# Altium footprint library MCx.PcbLib: 53 footprints (part 1 of 4)
Each footprint in its own frame and in the unit in brackets; x right, y up, seen from the top. Pads: shape width x height; smd on the part's side, far side on the other; paste and mask are expansions set on the pad; w line width, h text height; cw(c..) or ccw(c..) is an arc to the next point about the centre after c.
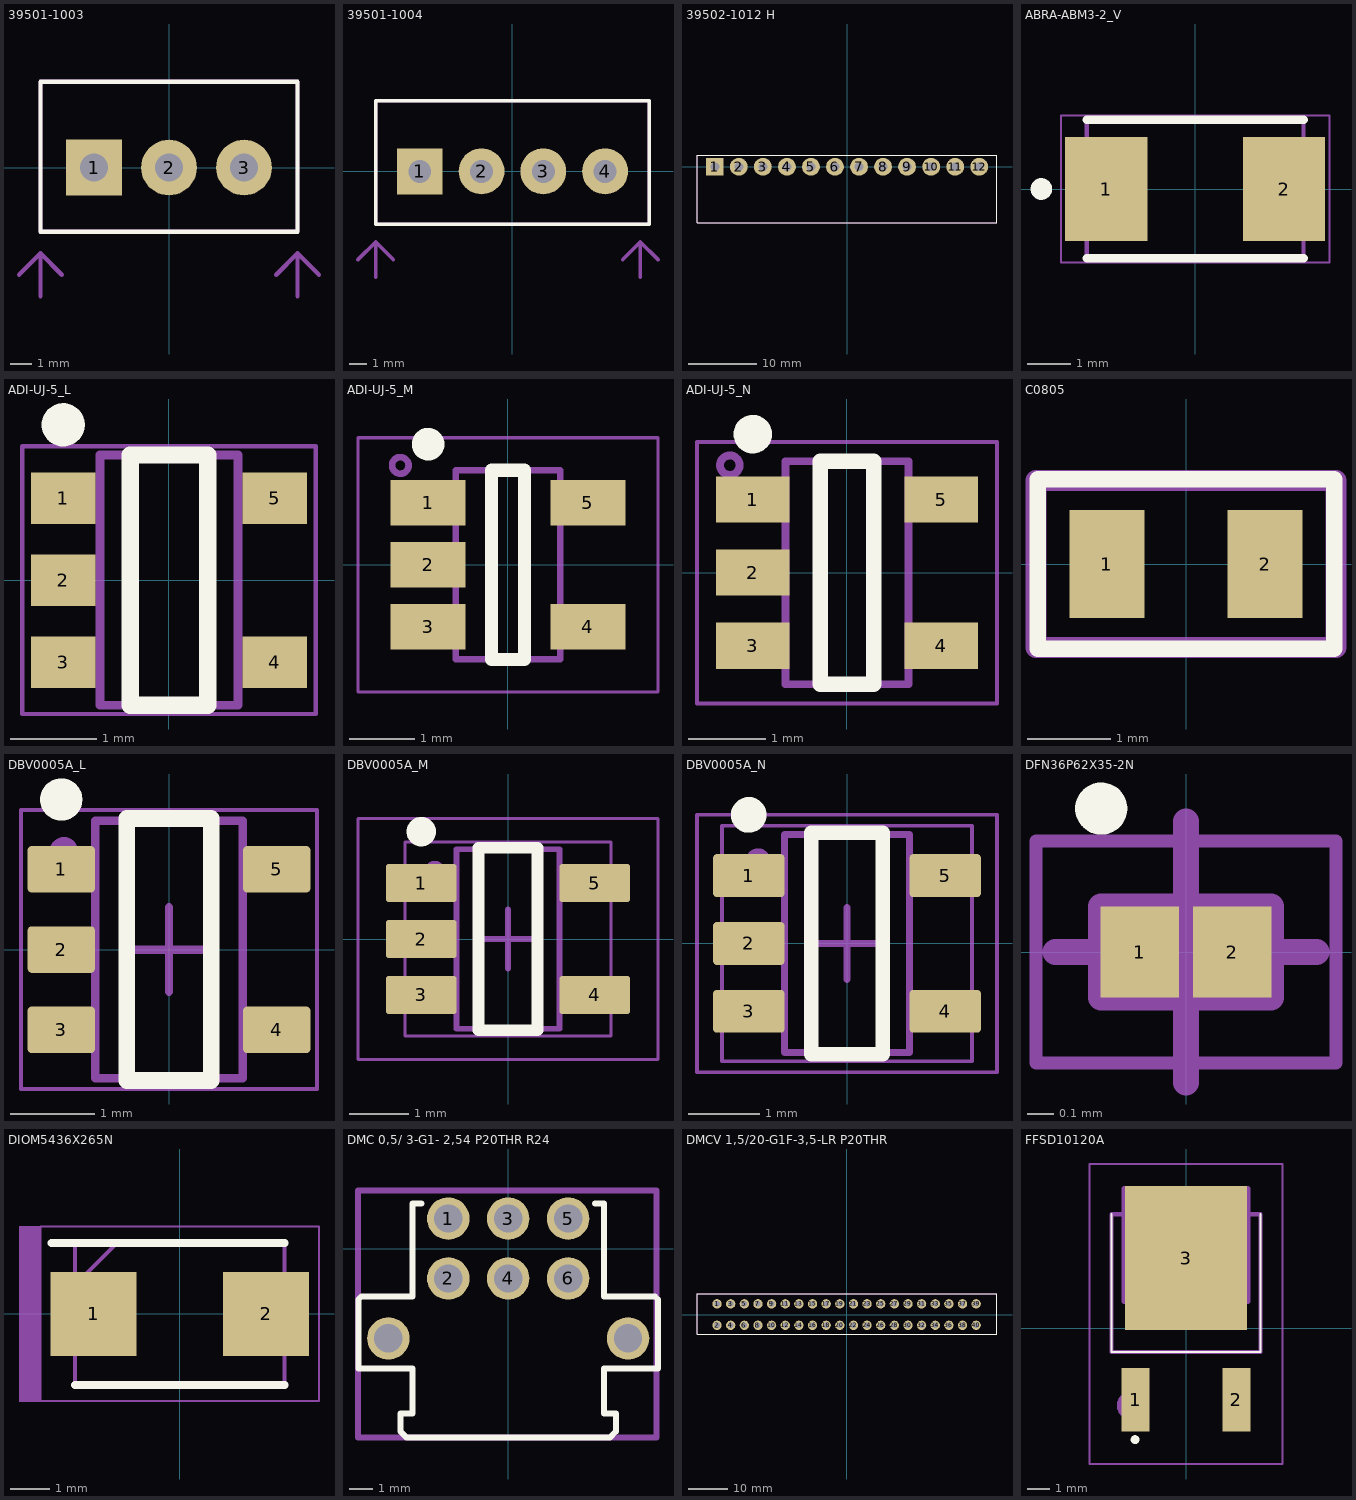
[diagram p0: the footprints below, top view; thin cyan lines are the x and y axes]

## 39501-1003 [mm] "Header 3x3.5mm Molex"
pads (3):
  rect 2.6x2.6 hole 1.3: 1(-3.5,0)
  round 2.6 hole 1.3: 2(0,0) 3(3.5,0)
Top Overlay:
  lines w0.203: -6,-3 -6,4 6,4 6,-3 -6,-3
Top Courtyard:
  lines w0.203: -6,-3 -6,4 6,4 6,-3 -6,-3
Mechanical 15:
  lines w0.203: -6,-6 -6,-5 -6,-4 ; -5,-5 -6,-4 ; 6,-6 6,-5 6,-4 ; 7,-5 6,-4 ; -6,-4 -7,-5 -6,-4 ; 6,-4 5,-5 6,-4
  text "39503-2003  / Wire Entry" at -3,-7 h1.52
Top Assembly (Mech29):
  lines w0.203: -6,-3 -6,4 6,4 6,-3 -6,-3
  text "'.Designator'" at -6.348,-0.423 h1.02
3D body "395011003.stp": height 9.16, standoff -3.54, extent -5.956,-2.794 5.956,4.064

## 39501-1004 [mm] "Header 3x3.5mm Molex"
pads (4):
  rect 2.6x2.6 hole 1.3: 1(-5.25,0)
  round 2.6 hole 1.3: 2(-1.75,0) 3(1.75,0) 4(5.25,0)
Top Overlay:
  lines w0.203: -7.75,-3 7.75,-3 7.75,4 -7.75,4 -7.75,-3
Top Courtyard:
  lines w0.203: -7.75,-3 7.75,-3 7.75,4 -7.75,4 -7.75,-3
Mechanical 15:
  lines w0.203: -7.75,-6 -7.75,-5 -7.75,-4 ; -6.75,-5 -7.75,-4 ; 7.25,-6 7.25,-5 7.25,-4 ; 8.25,-5 7.25,-4 ; -7.75,-4 -8.75,-5 -7.75,-4 ; 7.25,-4 6.25,-5 7.25,-4
  text "39503-2004 / Wire Entry" at -4,-7 h1.52
Top Assembly (Mech29):
  lines w0.203: -7.75,-3 7.75,-3 7.75,4 -7.75,4 -7.75,-3
  text "'.Designator'" at -6.348,-0.423 h1.02
3D body "395011004.stp": height 9.16, standoff -3.54, extent -7.696,-2.794 7.696,4.064

## 39502-1012 H [mm]
pads (12):
  rect 2.6x2.6 hole 1.3: 1(-19.25,0)
  round 2.6 hole 1.3: 2(-15.75,0) 3(-12.25,0) 4(-8.75,0) 5(-5.25,0) 6(-1.75,0) 7(1.75,0) 8(5.25,0) 9(8.75,0) 10(12.25,0) 11(15.75,0) 12(19.25,0)
Top Overlay:
  lines w0.102: -21.844,-8.128 21.844,-8.128 21.844,1.65 -21.844,1.65 -21.844,-8.128
Top Courtyard:
  lines w0.102: -21.844,-8.128 21.844,-8.128 21.844,1.65 -21.844,1.65 -21.844,-8.128
Top Assembly (Mech29):
  circle w0.102: c-19.304,0 r0.635
  lines w0.102: -21.844,-8.128 21.844,-8.128 21.844,1.65 -21.844,1.65 -21.844,-8.128
  text "'.Designator'" at -5.411,-3.338 h1
3D body "395021012.stp": height 6.87, standoff -3.54, extent -21.65,-7.874 21.759,1.27

## ABRA-ABM3-2_V [mm] "SMD, 2-Leads, Body 5x3.2mm, Pitch 4.1mm"
height 1.3
pads (2):
  rect 1.9x2.4 smd: 1(-2.05,0) 2(2.05,0)
Top Overlay:
  circle w0.25: c-3.55,0 r0.125
  lines w0.2: -2.5,-1.6 2.5,-1.6 ; -2.5,1.6 2.5,1.6
Mechanical 13:
  lines w0.1: -2.5,-1.6 -2.5,1.6 2.5,1.6 2.5,-1.6 -2.5,-1.6
Top Assembly (Mech29):
  lines w0.05: -3.1,-1.7 -3.1,1.7 3.1,1.7 3.1,-1.7 -3.1,-1.7
  text "'.Designator'" at -3.597,-0.264 h0.64
3D body "ABM3.STEP": height 1.3, standoff 0, extent -2.5,-1.6 2.5,1.6

## ADI-UJ-5_L [mm] "SOT23, 5-Leads, Body 2.9x1.6mm, Pitch 0.95mm, IPC High Density"
height 1
pads (5):
  rect 0.75x0.6 smd: 1(-1.225,0.95) 2(-1.225,0) 3(-1.225,-0.95) 4(1.225,-0.95) 5(1.225,0.95)
Top Overlay:
  circle w0.25: c-1.225,1.8 r0.125
  lines w0.2: -0.45,-1.45 -0.45,1.45 0.45,1.45 0.45,-1.45 -0.45,-1.45
Mechanical 13:
  lines w0.1: -0.8,-1.45 0.8,-1.45 0.8,1.45 -0.8,1.45 -0.8,-1.45
Top Assembly (Mech29):
  circle w0.102: c-1.27,1.016 r0.127
  lines w0.05: -1.7,-1.55 1.7,-1.55 1.7,1.55 -1.7,1.55 -1.7,-1.55
  text "'.Designator'" at -3.597,-0.264 h0.64
3D body: height 1, standoff 0, extent -0.8,-1.45 0.8,1.45

## ADI-UJ-5_M [mm] "SOT23, 5-Leads, Body 2.9x1.6mm, Pitch 0.95mm, IPC Low Density"
height 1
pads (5):
  rect 1.15x0.7 smd: 1(-1.225,0.95) 2(-1.225,0) 3(-1.225,-0.95) 4(1.225,-0.95) 5(1.225,0.95)
Top Overlay:
  circle w0.25: c-1.225,1.85 r0.125
  lines w0.2: -0.25,-1.45 -0.25,1.45 0.25,1.45 0.25,-1.45 -0.25,-1.45
Mechanical 13:
  lines w0.1: -0.8,-1.45 0.8,-1.45 0.8,1.45 -0.8,1.45 -0.8,-1.45
Top Assembly (Mech29):
  circle w0.102: c-1.651,1.524 r0.127
  lines w0.05: -2.3,-1.95 2.3,-1.95 2.3,1.95 -2.3,1.95 -2.3,-1.95
  text "'.Designator'" at -3.597,-0.264 h0.64
3D body: height 1, standoff 0, extent -0.8,-1.45 0.8,1.45

## ADI-UJ-5_N [mm] "SOT23, 5-Leads, Body 2.9x1.6mm, Pitch 0.95mm, IPC Medium Density"
height 1
pads (5):
  rect 0.95x0.6 smd: 1(-1.225,0.95) 2(-1.225,0) 3(-1.225,-0.95) 4(1.225,-0.95) 5(1.225,0.95)
Top Overlay:
  circle w0.25: c-1.225,1.8 r0.125
  lines w0.2: -0.35,-1.45 0.35,-1.45 0.35,1.45 -0.35,1.45 -0.35,-1.45
Mechanical 13:
  lines w0.1: -0.8,-1.45 -0.8,1.45 0.8,1.45 0.8,-1.45 -0.8,-1.45
Top Assembly (Mech29):
  circle w0.102: c-1.524,1.397 r0.127
  lines w0.05: -1.95,-1.7 -1.95,1.7 1.95,1.7 1.95,-1.7 -1.95,-1.7
  text "'.Designator'" at -3.597,-0.264 h0.64
3D body: height 1, standoff 0, extent -0.8,-1.45 0.8,1.45

## C0805 [mm]
pads (2):
  rect 0.9x1.3 smd: 1(-0.95,0) 2(0.95,0)
Top Overlay:
  lines w0.2: -1.778,-1.016 -1.778,1.016 1.778,1.016 1.778,-1.016 -1.778,-1.016
Top Assembly (Mech29):
  lines w0.254: -1.8,-1 -1.8,1 1.8,1 1.8,-1 -1.8,-1
  text ".Designator" at -3.174,-0.212 h0.64
3D body "CAPC2012X95N EIA 0805.step": height 1.5, standoff 0.55, extent -1,-0.6 1,0.6
3D body "CAPC2012X95N EIA 0805.step": height 0.95, standoff 0, extent -1,-0.6 1,0.6

## DBV0005A_L [mm] "SOT23, 5-Leads, Body 3.05x1.75mm, Pitch 0.95mm, IPC High Density"
height 1.45
pads (5):
  rrect18% 0.8x0.55 smd: 1(-1.275,0.95) 2(-1.275,0) 3(-1.275,-0.95) 4(1.275,-0.95) 5(1.275,0.95)
Top Overlay:
  circle w0.25: c-1.275,1.775 r0.125
  lines w0.2: -0.5,-1.55 -0.5,1.55 0.5,1.55 0.5,-1.55 -0.5,-1.55
Mechanical 1:
  text ".Designator" at -0.635,-0.254 h0.4
Mechanical 13:
  lines w0.1: -0.875,-1.525 0.875,-1.525 0.875,1.525 -0.875,1.525 -0.875,-1.525
Mechanical 15:
  lines w0.05: -1.75,-1.65 1.75,-1.65 1.75,1.65 -1.75,1.65 -1.75,-1.65
  lines w0.1: -0.5,0 0.5,0 ; 0,-0.5 0,0.5
Top Assembly (Mech29):
  circle w0.254: c-1.245,1.16 r0.043
  lines w0.05: -1.75,-1.65 1.75,-1.65 1.75,1.65 -1.75,1.65 -1.75,-1.65
  text "'.Designator'" at 0.237,-4.126 h0.7
3D body "DBV0005AaksMF05A.stp": height 1.08, standoff -0.01, extent -1.422,-1.461 1.422,1.46

## DBV0005A_M [mm] "SOT23, 5-Leads, Body 3.05x1.75mm, Pitch 0.95mm, IPC Low Density"
height 1.45
pads (5):
  rrect15% 1.2x0.65 smd: 1(-1.475,0.95) 2(-1.475,0) 3(-1.475,-0.95) 4(1.475,-0.95) 5(1.475,0.95)
Top Overlay:
  circle w0.25: c-1.475,1.825 r0.125
  lines w0.2: -0.5,-1.55 0.5,-1.55 0.5,1.55 -0.5,1.55 -0.5,-1.55
Mechanical 1:
  text ".Designator" at -0.635,-0.127 h0.4
Mechanical 13:
  lines w0.1: -0.875,-1.525 -0.875,1.525 0.875,1.525 0.875,-1.525 -0.875,-1.525
Mechanical 15:
  lines w0.05: -2.55,-2.05 -2.55,2.05 2.55,2.05 2.55,-2.05 -2.55,-2.05
  lines w0.1: -0.5,0 0.5,0 ; 0,-0.5 0,0.5
Top Assembly (Mech29):
  circle w0.254: c-1.245,1.16 r0.043
  lines w0.05: -1.75,-1.65 -1.75,1.65 1.75,1.65 1.75,-1.65 -1.75,-1.65
  text "'.Designator'" at 0.266,-1.501 h0.7
3D body "DBV0005AaksMF05A.stp": height 1.08, standoff -0.01, extent -1.422,-1.461 1.422,1.46

## DBV0005A_N [mm] "SOT23, 5-Leads, Body 3.05x1.75mm, Pitch 0.95mm, IPC Medium Density"
height 1.45
pads (5):
  rrect17% 1x0.6 smd: 1(-1.375,0.95) 2(-1.375,0) 3(-1.375,-0.95) 4(1.375,-0.95) 5(1.375,0.95)
Top Overlay:
  circle w0.25: c-1.375,1.8 r0.125
  lines w0.2: -0.5,-1.55 0.5,-1.55 0.5,1.55 -0.5,1.55 -0.5,-1.55
Mechanical 1:
  text ".Designator" at -0.635,-0.254 h0.4
Mechanical 13:
  lines w0.1: -0.875,-1.525 -0.875,1.525 0.875,1.525 0.875,-1.525 -0.875,-1.525
Mechanical 15:
  lines w0.05: -2.1,-1.8 -2.1,1.8 2.1,1.8 2.1,-1.8 -2.1,-1.8
  lines w0.1: -0.5,0 0.5,0 ; 0,-0.5 0,0.5
Top Assembly (Mech29):
  circle w0.254: c-1.245,1.16 r0.043
  lines w0.05: -1.75,-1.65 -1.75,1.65 1.75,1.65 1.75,-1.65 -1.75,-1.65
  text "'.Designator'" at 0.266,-1.501 h0.7
3D body "DBV0005AaksMF05A.stp": height 1.08, standoff -0.01, extent -1.422,-1.461 1.422,1.46

## DFN36P62X35-2N [mm] "DFN, 2-Leads, Body 0.32x0.62mm, Pitch 0.36mm, IPC Medium Density"
height 0.35
pads (2):
  rect 0.3x0.35 smd: 1(-0.178,0) 2(0.178,0)
Top Overlay:
  circle w0.1: c-0.325,0.55 r0.05
Top Courtyard:
  lines w0.05: -0.575,-0.425 0.575,-0.425 0.575,0.425 -0.575,0.425 -0.575,-0.425
  lines w0.1: -0.5,0 0.5,0 ; 0,-0.5 0,0.5
Top Assembly (Mech29):
  lines w0.1: -0.325,-0.175 0.325,-0.175 0.325,0.175 -0.325,0.175 -0.325,-0.175
3D body "DFN36P62X35-2N.step": height 0.35, standoff 0, extent -0.323,-0.172 0.323,0.172

## DIOM5436X265N [mm]
pads (2):
  rect 2.2x2.15 smd: 1(-2.2,0) 2(2.2,0)
Top Overlay:
  lines w0.2: -3.275,1.812 2.675,1.812 ; -2.675,-1.812 2.675,-1.812
Mechanical 13:
  lines w0.1: -2.675,0.738 -1.6,1.812 ; -2.675,-1.812 -2.675,1.812 2.675,1.812 2.675,-1.812 -2.675,-1.812
Mechanical 15:
  lines w0.05: -3.55,-2.225 -3.55,2.225 3.55,2.225 3.55,-2.225 -3.55,-2.225
Top Assembly (Mech29):
  rectangle: -4.102,-2.25 -3.55,2.248
  lines w0.05: -3.55,-2.225 -3.55,2.225 3.55,2.225 3.55,-2.225 -3.55,-2.225
  text "'.Designator'" at -3.965,-0.292 h0.7
3D body "STPS340UY.stp": height 2.65, standoff 0, extent -2.675,-1.813 2.675,1.813

## DMC 0,5/ 3-G1- 2,54 P20THR R24 [mm] "Pluggable terminal bolc 1844730"
pads (8):
  round 1.8 hole 1.2: 1(-2.54,1.27) 2(-2.54,-1.27) 3(0,1.27) 4(0,-1.27) 5(2.54,1.27) 6(2.54,-1.27) ""(-5.08,-3.81) ""(5.08,-3.81)
Top Overlay:
  lines w0.254: -3.683,1.905 -4.064,1.905 -4.064,-2.032 -6.223,-2.032 -6.35,-2.159 -6.35,-5.08 -4.064,-5.08 -4.064,-6.985 -4.572,-6.985 -4.572,-7.747 -4.318,-8.001 4.318,-8.001 4.572,-7.747 4.572,-6.985 4.064,-6.985 4.064,-5.08 6.35,-5.08 6.35,-2.159 6.223,-2.032 4.064,-2.032 4.064,1.905 3.683,1.905
Top Courtyard:
  lines w0.254: -6.366,-8.001 6.294,-8.001 6.294,2.449 -6.366,2.449 -6.366,-8.001
Top Assembly (Mech29):
  circle w0.102: c-2.54,1.27 r0.458
  lines w0.254: -6.366,-8.001 6.294,-8.001 6.294,2.449 -6.366,2.449 -6.366,-8.001
  text "'.Designator'" at -4.469,-3.391 h0.76
3D body "pxc_1844730_04_DMC-0-5-3-G1-2-54-P20THR-R24_3D.stp": height 7.39, standoff -2, extent -6.1,-8.05 6.11,1.87

## DMCV 1,5/20-G1F-3,5-LR P20THR [mm] "1787577  footprint"
pads (40):
  round 2.4 hole 1.4: 1(-33.25,2.75) 2(-33.25,-2.75) 3(-29.75,2.75) 4(-29.75,-2.75) 5(-26.25,2.75) 6(-26.25,-2.75) 7(-22.75,2.75) 8(-22.75,-2.75) 9(-19.25,2.75) 10(-19.25,-2.75) 11(-15.75,2.75) 12(-15.75,-2.75) 13(-12.25,2.75) 14(-12.25,-2.75) 15(-8.75,2.75) 16(-8.75,-2.75) 17(-5.25,2.75) 18(-5.25,-2.75) 19(-1.75,2.75) 20(-1.75,-2.75) 21(1.75,2.75) 22(1.75,-2.75) 23(5.25,2.75) 24(5.25,-2.75) 25(8.75,2.75) 26(8.75,-2.75) 27(12.25,2.75) 28(12.25,-2.75) 29(15.75,2.75) 30(15.75,-2.75) 31(19.25,2.75) 32(19.25,-2.75) 33(22.75,2.75) 34(22.75,-2.75) 35(26.25,2.75) 36(26.25,-2.75) 37(29.75,2.75) 38(29.75,-2.75) 39(33.25,2.75) 40(33.25,-2.75)
Top Overlay:
  lines w0.254: -38.4,-5.1 -38.4,5.4 38.6,5.4 38.6,-5.1 -38.4,-5.1
Top Courtyard:
  lines w0.254: -38.4,-5.1 -38.4,5.4 38.6,5.4 38.6,-5.1 -38.4,-5.1
Top Assembly (Mech29):
  circle w0.254: c-33.3,2.7 r0.721
  lines w0.254: -38.4,-5.1 -38.4,5.4 38.6,5.4 38.6,-5.1 -38.4,-5.1
  text "'.Designator'" at -8.633,-0.735 h1.52
3D body "pxc_1787577_01_DMCV-1-5-20-G1F-3-5-LR-P20THR_3D.stp": height 10.12, standoff -1.91, extent -38.353,-5.159 38.651,5.441

## FFSD10120A [mm]
pads (3):
  rect 1.25x2.85 smd: 1(-2.28,-3.24) 2(2.28,-3.24)
  rect 5.5x6.5 smd: 3(0,3.16)
Top Overlay:
  lines w0.1: -3.365,5.14 -3.365,-1.08 3.365,-1.08 3.365,5.14
  lines w0.2: -2.4,-5.04 cw(c-2.3,-5.04) -2.2,-5.04 cw(c-2.3,-5.04) -2.4,-5.04
Mechanical 13:
  lines w0.2: -3.365,-1.08 -3.365,5.14 3.365,5.14 3.365,-1.08 -3.365,-1.08
Mechanical 15:
  lines w0.1: -4.365,-6.14 -4.365,7.41 4.365,7.41 4.365,-6.14 -4.365,-6.14
Top Assembly (Mech29):
  circle w0.254: c-2.5,-3.5 r0.5
  lines w0.1: -4.365,-6.14 -4.365,7.41 4.365,7.41 4.365,-6.14 -4.365,-6.14
  lines w0.254: -2.794,1.206 -2.794,6.294 2.794,6.294 2.794,1.206 -2.794,1.206
  text "'.Designator'" at -3.4,-0.167 h0.7
3D body "DPAK229P998X239-3N.step": height 2.39, standoff 0, extent -3.375,-4.285 3.375,5.695